# Altium footprint library 10A_Motor_Driver.PcbLib: 68 footprints (part 2 of 5)
Each footprint in its own frame and in the unit in brackets; x right, y up, seen from the top. Pads: shape width x height; smd on the part's side, far side on the other; paste and mask are expansions set on the pad; w line width, h text height; cw(c..) or ccw(c..) is an arc to the next point about the centre after c.
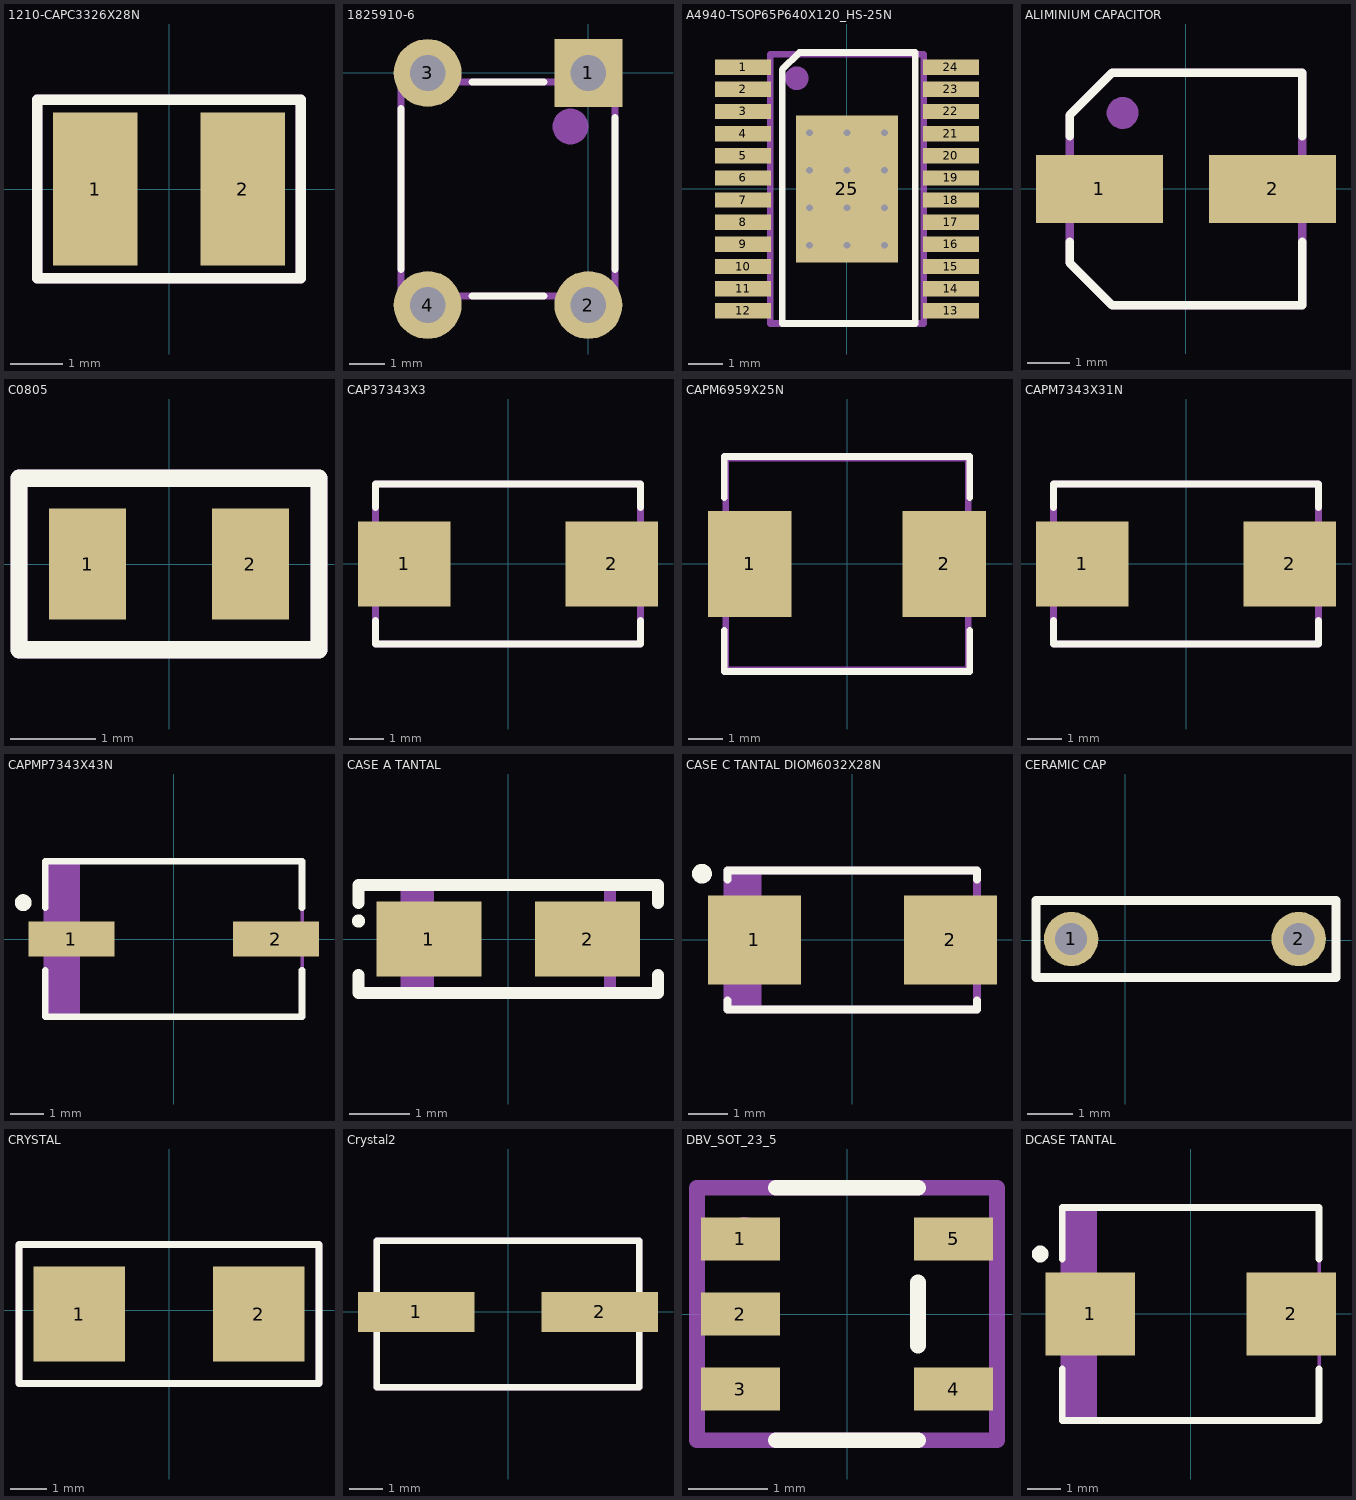
[diagram p1: the footprints below, top view; thin cyan lines are the x and y axes]

## 1210-CAPC3326X28N [mm] "Chip Capacitor, 2-Leads, Body 3,30x2,60mm, IPC Medium Density"
height 2.8
pads (2):
  rect 1.6x2.9 smd: 1(-1.4,0) 2(1.4,0)
Top Overlay:
  lines w0.2: -2.5,-1.7 2.5,-1.7 2.5,1.7 -2.5,1.7 -2.5,-1.7
Top Assembly (Mech29):
  lines w0.2: -2.5,-1.7 -2.5,1.7 2.5,1.7 2.5,-1.7 -2.5,-1.7
  text ".Designator" at -1.5,-0.567 h1
3D body "1210-CAPC3326X28N.step": height 2.8, standoff 0, extent -1.85,-1.45 1.85,1.45

## 1825910-6 [mm]
pads (4):
  rect 1.9x1.9 hole 1: 1(0,0)
  round 1.9 hole 1: 2(0,-6.5) 3(-4.5,0) 4(-4.5,-6.5)
Top Overlay:
  lines w0.2: -5.25,-5.5 -5.25,-3.25 -5.25,-1 ; -3.25,-6.25 -1.25,-6.25 ; -3.25,-0.25 -1.25,-0.25 ; 0.75,-3.25 0.75,-5.5 0.75,-1.25
Top Assembly (Mech29):
  circle w0.5: c-0.5,-1.5 r0.25
  lines w0.2: -5.25,-6.25 -5.25,-0.25 -2,-0.25 0.75,-0.25 0.75,-6.25 -5.25,-6.25
  text ".Designator" at -4,-4.867 h1.6
3D body "User Library-FSM4JLH(1825910-5).step": height 5.01, standoff -3.5, extent -5.245,-7.148 0.745,0.65

## A4940-TSOP65P640X120_HS-25N [mm] "TSOP, 24-Leads, Body 7,80x4,40mm, Pitch 0,65mm, Thermal Pad 4,32x3,00mm, IPC Medium Density"
height 1.2
pads (25):
  rect 1.65x0.45 smd mask+0.06: 1(-3.05,3.575) 2(-3.05,2.925) 3(-3.05,2.275) 4(-3.05,1.625) 5(-3.05,0.975) 6(-3.05,0.325) 7(-3.05,-0.325) 8(-3.05,-0.975) 9(-3.05,-1.625) 10(-3.05,-2.275) 11(-3.05,-2.925) 12(-3.05,-3.575) 13(3.05,-3.575) 14(3.05,-2.925) 15(3.05,-2.275) 16(3.05,-1.625) 17(3.05,-0.975) 18(3.05,-0.325) 19(3.05,0.325) 20(3.05,0.975) 21(3.05,1.625) 22(3.05,2.275) 23(3.05,2.925) 24(3.05,3.575)
  rect 3x4.32 smd: 25(0,0)
via 1.1,-1.65 diameter 0.5 hole 0.2
via 0,-1.65 diameter 0.5 hole 0.2
via -1.1,-1.65 diameter 0.5 hole 0.2
via 1.1,-0.55 diameter 0.5 hole 0.2
via 0,-0.55 diameter 0.5 hole 0.2
via -1.1,-0.55 diameter 0.5 hole 0.2
via 1.1,0.55 diameter 0.5 hole 0.2
via 0,0.55 diameter 0.5 hole 0.2
via -1.1,0.55 diameter 0.5 hole 0.2
via 1.1,1.65 diameter 0.5 hole 0.2
via 0,1.65 diameter 0.5 hole 0.2
via -1.1,1.65 diameter 0.5 hole 0.2
Top Overlay:
  lines w0.2: -1.9,-3.95 2,-3.95 2,4 -1.4,4 -1.9,3.5 -1.9,-3.95
Top Assembly (Mech29):
  circle w0.4: c-1.475,3.25 r0.146
  lines w0.2: -2.25,-3.95 2.25,-3.95 2.25,3.95 -2.25,3.95 -2.25,-3.95
  text ".Designator" at 1.751,-3.449 h1.2
3D body "TSOP65P640X120_HS-25N.step": height 1.2, standoff 0, extent -3.2,-3.95 3.2,3.95

## ALIMINIUM CAPACITOR [mm]
pads (2):
  rect 3x1.6 smd: 1(-2.05,0) 2(2.05,0)
Top Overlay:
  lines w0.2: -2.75,-1.25 -2.75,-1.75 -1.75,-2.75 2.75,-2.75 2.75,-1.25 ; -2.75,1.25 -2.75,1.75 -1.75,2.75 2.75,2.75 2.75,1.25
Top Assembly (Mech29):
  circle w0.4: c-1.5,1.8 r0.177
  lines w0.2: -2.75,-1.75 -1.75,-2.75 2.75,-2.75 2.75,2.75 -1.75,2.75 -2.75,1.75 -2.75,-1.75
  text ".Designator" at -1.8,-2.033 h0.8
3D body "capacitor size C.step": height 5.42, standoff 0.01, extent -2.95,-2.7 2.95,2.6

## C0805 [mm]
pads (2):
  rect 0.9x1.3 smd: 1(-0.95,0) 2(0.95,0)
Top Overlay:
  lines w0.2: -1.75,-1 1.75,-1 1.75,1 -1.75,1 -1.75,-1
Assembly Notes:
  lines w0.2: -1.75,-1 -1.75,1 1.75,1 1.75,-1 -1.75,-1
Top Assembly (Mech29):
  lines w0.2: -1.75,-1 1.75,-1 1.75,1 -1.75,1 -1.75,-1
  text ".Designator" at -1.35,-0.683 h0.8
3D body "CAPC2012X95N EIA 0805.step": height 1.2, standoff 0, extent -1.025,-0.45 0.975,0.5

## CAP37343X3 [mm]
pads (2):
  rect 2.65x2.45 smd: 1(-2.975,0) 2(2.975,0)
Top Overlay:
  lines w0.2: -3.8,-1.625 -3.8,-2.3 3.8,-2.3 3.8,-1.625 ; -3.8,1.625 -3.8,2.3 3.8,2.3 3.8,1.625
Top Assembly (Mech29):
  lines w0.2: -3.8,-2.3 3.8,-2.3 3.8,2.3 -3.8,2.3 -3.8,-2.3
3D body "CAPM7343X31N.step": height 3.1, standoff 0, extent -4.02,-2.3 4.02,2.3

## CAPM6959X25N [mm] "Molded Capacitor, 2-Leads, Body 6,86x5,91mm, IPC Medium Density"
height 2.5
pads (2):
  rect 2.45x3.1 smd: 1(-2.85,0) 2(2.85,0)
Top Overlay:
  lines w0.2: -3.6,-1.95 -3.6,-3.15 3.6,-3.15 3.6,-1.95 ; -3.6,1.95 -3.6,3.15 3.6,3.15 3.6,1.95
Top Assembly (Mech29):
  lines w0.2: -3.555,-3.11 3.555,-3.11 3.555,3.11 -3.555,3.11 -3.555,-3.11
3D body "CAPM6959X25N.step": height 2.5, standoff 0, extent -3.775,-3.11 3.775,3.11

## CAPM7343X31N [mm] "Molded Capacitor, 2-Leads, Body 7,30x4,30mm, IPC Medium Density"
height 3.1
pads (2):
  rect 2.65x2.45 smd: 1(-2.975,0) 2(2.975,0)
Top Overlay:
  lines w0.2: -3.8,-1.625 -3.8,-2.3 3.8,-2.3 3.8,-1.625 ; -3.8,1.625 -3.8,2.3 3.8,2.3 3.8,1.625
Top Assembly (Mech29):
  lines w0.2: -3.8,-2.3 3.8,-2.3 3.8,2.3 -3.8,2.3 -3.8,-2.3
3D body "CAPM7343X31N.step": height 3.1, standoff 0, extent -4.02,-2.3 4.02,2.3

## CAPMP7343X43N [mm] "Molded Capacitor, 2-Leads, Body 7,30x4,30mm, IPC Medium Density"
height 4.3
pads (2):
  rect 2.55x1.05 smd: 1(-3.025,0) 2(3.025,0)
Top Overlay:
  circle w0.25: c-4.45,1.075 r0.125
  lines w0.2: -3.8,-0.925 -3.8,-2.3 3.8,-2.3 3.8,-0.925 ; -3.8,0.925 -3.8,2.3 3.8,2.3 3.8,0.925
Top Assembly (Mech29):
  rectangle: -3.8,-2.3 -2.778,2.3
  lines w0.1: -3.8,-2.3 -3.8,2.3 3.8,2.3 3.8,-2.3 -3.8,-2.3
3D body "CAPMP7343X43N.step": height 4.3, standoff 0, extent -4.02,-2.3 4.02,2.3

## CASE A TANTAL [mm] "Molded Diode, 2-Leads, Body 3,20x1,60mm, IPC Medium Density"
height 1.8
pads (2):
  rect 1.75x1.25 smd: 1(-1.325,0) 2(1.325,0)
Top Overlay:
  circle w0.2: c-2.5,0.3 r0.01
  lines w0.2: -2.5,-0.6 -2.5,-0.9 -2.2,-0.9 2.5,-0.9 2.5,-0.6 ; -2.5,0.6 -2.5,0.9 2.5,0.9 2.5,0.6
Top Assembly (Mech29):
  rectangle: -1.7,-0.9 -1.243,0.9
  lines w0.2: -1.7,-0.9 1.7,-0.9 1.7,0.9 -1.7,0.9 -1.7,-0.9
3D body "User Library-CaseA.step": height 1.65, standoff -0.01, extent -1.731,-0.8 1.732,0.8

## CASE C TANTAL DIOM6032X28N [mm] "Molded Diode, 2-Leads, Body 6,00x3,20mm, IPC Medium Density"
height 2.8
pads (2):
  rect 2.35x2.25 smd: 1(-2.475,0) 2(2.475,0)
Top Overlay:
  circle w0.25: c-3.8,1.675 r0.125
  lines w0.2: -3.15,-1.525 -3.15,-1.75 3.15,-1.75 3.15,-1.525 ; -3.15,1.525 -3.15,1.75 3.15,1.75 3.15,1.525
Top Assembly (Mech29):
  rectangle: -3.15,-1.75 -2.303,1.75
  lines w0.2: -3.15,-1.75 -3.15,1.75 3.15,1.75 3.15,-1.75 -3.15,-1.75
3D body "User Library-Tantalum Capacitor Case C.STEP": height 2.7, standoff 0.01, extent -3.093,-1.605 3.093,1.6

## CERAMIC CAP [mm]
pads (2):
  round 1.2 hole 0.7: 1(-1.2,0.025) 2(3.825,0.025)
Top Overlay:
  lines w0.2: -1.975,-0.825 -1.975,0.875 4.65,0.875 4.65,-0.825 -1.975,-0.825
3D body "User Library-Disc_CAP d6x3_5_5mm.step": height 8.6, standoff -1.52, extent -1.7,-1 4.3,1.1

## CRYSTAL [mm]
pads (2):
  rect 2.5x2.6 smd: 1(-2.45,-0.1) 2(2.45,-0.1)
Top Overlay:
  lines w0.2: -4.1,-2 -4.1,1.8 4.1,1.8 4.1,-2 -4.1,-2
Top Assembly (Mech29):
  lines w0.2: -4.1,-2 -4.1,1.8 4.1,1.8 4.1,-2 -4.1,-2
  text ".Designator" at -3.1,-1.467 h1.6
3D body "ABM7.STEP": height 1.41, standoff 0.01, extent -2.997,-1.852 2.997,1.653

## Crystal2 [mm]
height 2.3
pads (2):
  rect 3.5x1.2 smd: 1(-2.75,0) 2(2.75,0)
Top Overlay:
  lines w0.2: -3.937,-2.261 -3.937,2.134 3.937,2.134 3.937,-2.261 -3.937,-2.261
Top Assembly (Mech29):
  lines w0.2: -3.937,-2.261 3.937,-2.261 3.937,2.134 -3.937,2.134 -3.937,-2.261
  text ".Designator" at -0.056,-0.068 h0.8
3D body "User Library-CSM-3X.STEP": height 2.3, standoff 0, extent -3.8,-2.108 3.8,1.992

## DBV_SOT_23_5 [mm]
pads (5):
  rect 1x0.55 smd: 1(-1.35,0.95) 2(-1.35,0) 3(-1.35,-0.95) 4(1.35,-0.95) 5(1.35,0.95)
Top Overlay:
  lines w0.2: -0.9,-1.6 0.9,-1.6 ; -0.9,1.6 0.9,1.6 ; 0.9,-0.4 0.9,0.4
Top Assembly (Mech29):
  circle w0.254: c-1.3,1 r0.1
  lines w0.2: -1.9,-1.6 -1.9,1.6 1.9,1.6 1.9,-1.6 -1.9,-1.6
  text ".Designator" at -1.1,-0.8 h0.6
3D body "User Library-TPS79333DBVR.step": height 1.61, standoff -0.01, extent -1.513,-1.525 1.514,1.525

## DCASE TANTAL [mm]
height 3.1
pads (2):
  rect 2.65x2.45 smd: 1(-2.975,0) 2(2.975,0)
Top Overlay:
  circle w0.25: c-4.45,1.775 r0.125
  lines w0.2: -3.8,-1.625 -3.8,-3.15 3.8,-3.15 3.8,-1.625 ; -3.8,1.625 -3.8,3.15 3.8,3.15 3.8,1.625
Top Assembly (Mech29):
  rectangle: -3.8,-3.15 -2.778,3.15
  lines w0.1: -3.8,-3.15 3.8,-3.15 3.8,3.15 -3.8,3.15 -3.8,-3.15
  text ".Designator" at -0.096,-0.105 h1.5
3D body "t491d227k016at.stp": height 3.05, standoff -0.05, extent -3.8,-2.3 3.8,2.3